# Altium footprint library csy.PcbLib: 198 footprints (part 11 of 13)
Each footprint in its own frame and in the unit in brackets; x right, y up, seen from the top. Pads: shape width x height; smd on the part's side, far side on the other; paste and mask are expansions set on the pad; w line width, h text height; cw(c..) or ccw(c..) is an arc to the next point about the centre after c.
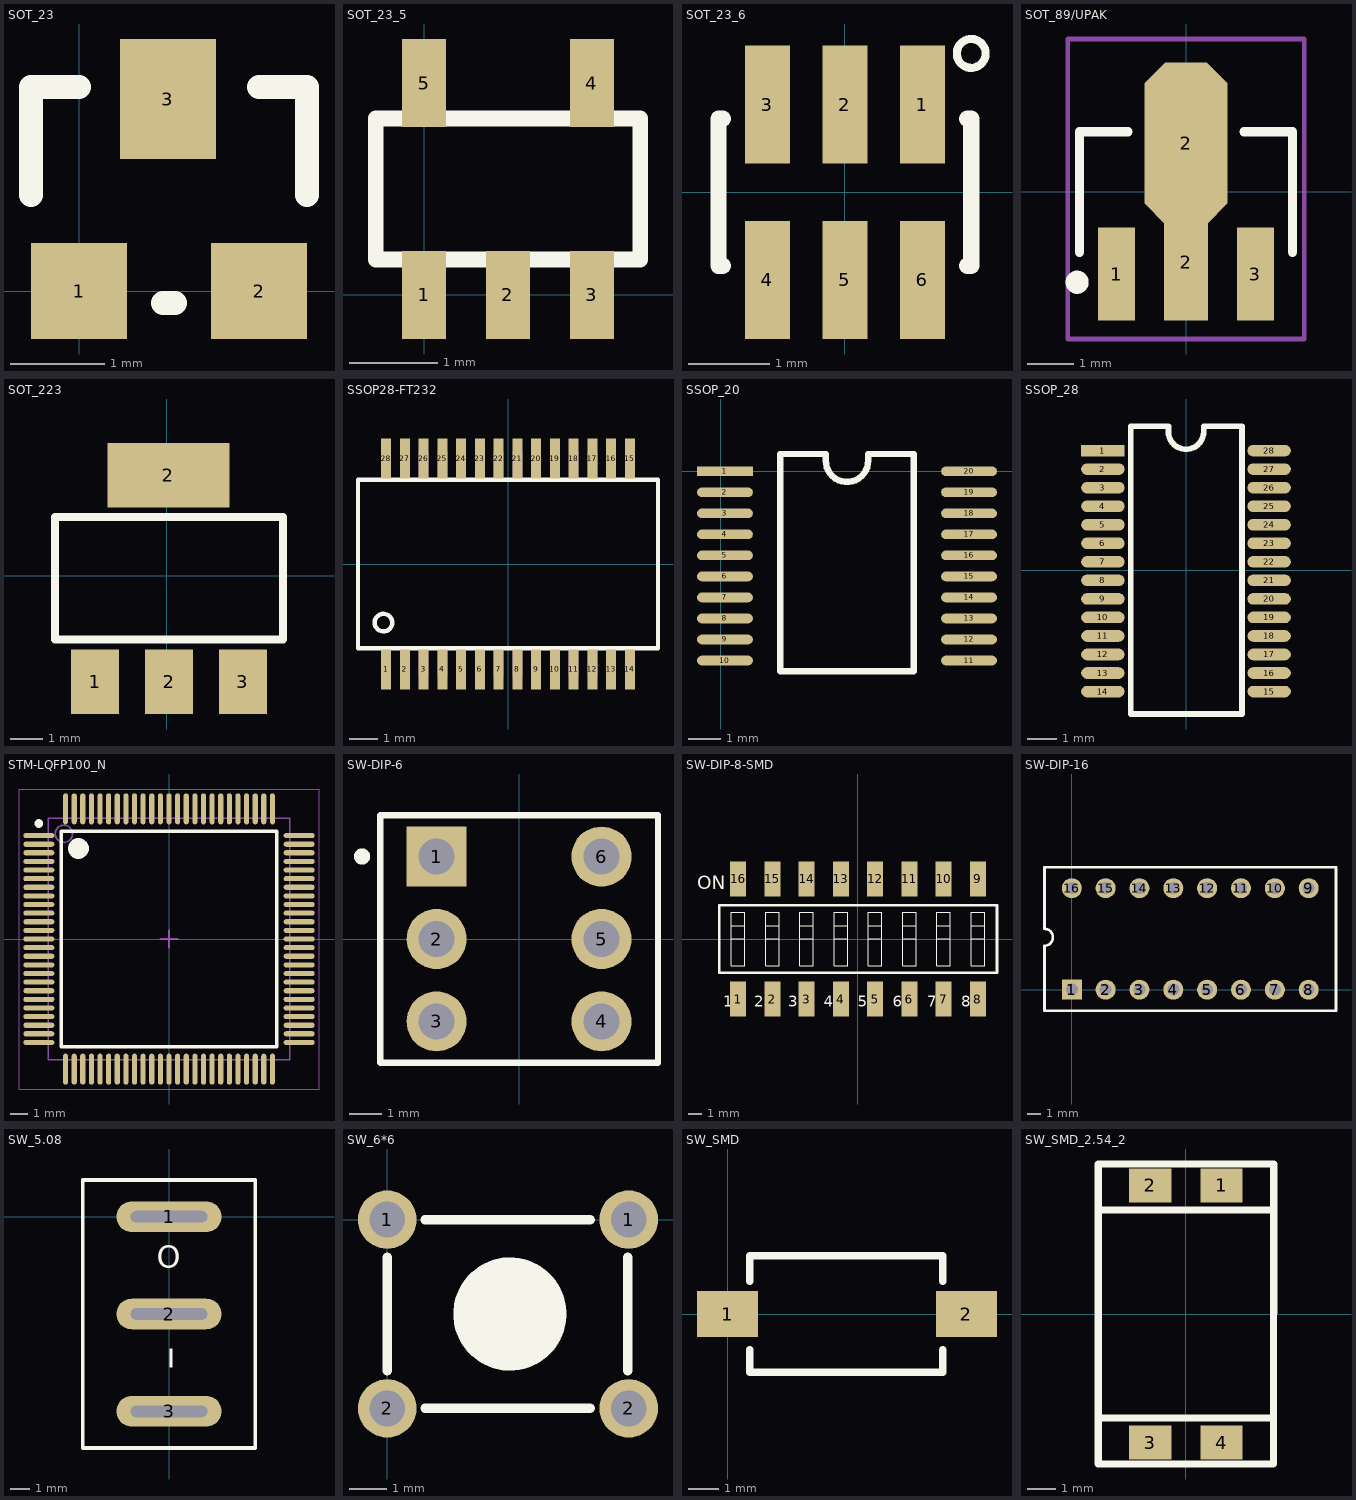
[diagram p10: the footprints below, top view; thin cyan lines are the x and y axes]

## SOT_23 [mil]
pads (3):
  rect 40x40 smd: 1(0,0) 2(75,0)
  rect 40x50 smd: 3(37,80)
Top Overlay:
  lines w10: -20,40 -20,85 0,85 ; 35,-5 40,-5 ; 75,85 95,85 95,40
3D body "SOT-23-3.STEP": height 47.24, standoff 0, extent -19.76,-11.65 94.42,98.59

## SOT_23_5 [mm]
pads (5):
  rect 0.5x1 smd: 1(0,0) 2(0.95,0) 3(1.9,0) 4(1.9,2.4) 5(0,2.4)
Top Overlay:
  lines w0.178: -0.55,0.4 -0.55,2 2.45,2 2.45,0.4 -0.55,0.4
3D body "User Library-SOT23-5.STEP": height 1.09, standoff -0.01, extent -0.5,-0.201 2.399,2.599

## SOT_23_6 [mm] "SOT-23/SC-74A; 5 Leads; Body 3.1 x 3 mm, inc. leads (LxW max)"
height 1.45
pads (6):
  rect 0.55x1.45 smd: 1(0.95,1.075) 2(0,1.075) 3(-0.95,1.075) 4(-0.95,-1.075) 5(0,-1.075) 6(0.95,-1.075)
Top Overlay:
  circle w0.1: c1.549,1.702 r0.177
  lines w0.2: -1.5,-0.9 -1.55,-0.9 -1.55,0.9 -1.5,0.9 ; 1.5,-0.9 1.55,-0.9 1.55,0.9 1.5,0.9
3D body "User Library-SOT-23-6.STEP": height 1.08, standoff -0.01, extent -1.397,-1.194 1.397,1.232

## SOT_89/UPAK [mm]
height 1.6
pads (4):
  rect 0.8x2 smd: 1(-1.5,-1.773) 3(1.5,-1.773)
  rect 0.96x2.5 smd: 2(0,-1.523)
  oct 1.8x3.5 smd: 2(0,1.049)
Top Overlay:
  circle w0.25: c-2.35,-1.95 r0.125
  lines w0.2: -2.3,-1.3 -2.3,1.3 -1.25,1.3 ; 1.25,1.3 2.3,1.3 2.3,-1.3
Mechanical 15:
  lines w0.1: -0.5,0 0.5,0 ; 0,-0.5 0,0.5 ; -2.55,-3.175 -2.55,3.302 2.55,3.302 2.55,-3.175 -2.55,-3.175
3D body "SOT_89.STEP": height 1.52, standoff 0.01, extent -2.25,-2.325 2.25,1.825

## SOT_223 [mil]
pads (4):
  rect 59x79 smd: 1(-88,-130) 2(2.55,-130) 3(93.1,-130)
  rect 150x79 smd: 2(1.88,123.54)
Top Overlay:
  lines w10: -137.45,-78 142.55,-78 142.55,72 -137.45,72 -137.45,-78
3D body: height 66.93, standoff 0, extent -126.41,-138.72 129.5,135.3

## SSOP28-FT232 [mm]
pads (28):
  rect 0.348x1.397 smd: 1(-4.225,-3.656) 2(-3.575,-3.656) 3(-2.925,-3.656) 4(-2.275,-3.656) 5(-1.625,-3.656) 6(-0.975,-3.656) 7(-0.325,-3.656) 8(0.325,-3.656) 9(0.975,-3.656) 10(1.625,-3.656) 11(2.275,-3.656) 12(2.925,-3.656) 13(3.575,-3.656) 14(4.225,-3.656) 15(4.225,3.656) 16(3.575,3.656) 17(2.925,3.656) 18(2.275,3.656) 19(1.625,3.656) 20(0.975,3.656) 21(0.325,3.656) 22(-0.325,3.656) 23(-0.975,3.656) 24(-1.625,3.656) 25(-2.275,3.656) 26(-2.925,3.656) 27(-3.575,3.656) 28(-4.225,3.656)
Top Overlay:
  circle w0.152: c-4.318,-2.032 r0.305
  lines w0.152: -5.2,-2.925 -5.2,2.925 5.2,2.925 5.2,-2.925 -5.2,-2.925
Mechanical 4:
  drawing of 56 lines, arcs and shapes, not listed

## SSOP_20 [mm]
pads (20):
  rect 1.727x0.3 smd: 1(0.127,0)
  oval 1.727x0.3 smd: 2(0.127,-0.65) 3(0.127,-1.3) 4(0.127,-1.95) 5(0.127,-2.6) 6(0.127,-3.25) 7(0.127,-3.9) 8(0.127,-4.55) 9(0.127,-5.2) 10(0.127,-5.85) 11(7.673,-5.85) 12(7.673,-5.2) 13(7.673,-4.55) 14(7.673,-3.9) 15(7.673,-3.25) 16(7.673,-2.6) 17(7.673,-1.95) 18(7.673,-1.3) 19(7.673,-0.65) 20(7.673,0)
Top Overlay:
  lines w0.2: 1.835,-6.175 5.965,-6.175 5.965,0.533 4.555,0.533 4.555,0.325 cw(c3.9,0.325) 3.245,0.325 3.245,0.533 1.835,0.533 1.835,-6.175
3D body "SSOP-20.STEP": height 1.79, standoff -0.05, extent -0.013,-6.52 7.887,0.78

## SSOP_28 [mm]
pads (28):
  rect 1.5x0.4 smd: 1(-2.869,4.127)
  oval 1.5x0.4 smd: 2(-2.869,3.488) 3(-2.869,2.848) 4(-2.869,2.208) 5(-2.869,1.568) 6(-2.869,0.928) 7(-2.869,0.288) 8(-2.869,-0.352) 9(-2.869,-0.992) 10(-2.869,-1.631) 11(-2.869,-2.271) 12(-2.869,-2.911) 13(-2.869,-3.551) 14(-2.87,-4.191) 15(2.869,-4.191) 16(2.869,-3.551) 17(2.869,-2.911) 18(2.869,-2.271) 19(2.869,-1.631) 20(2.869,-0.992) 21(2.869,-0.352) 22(2.869,0.288) 23(2.869,0.928) 24(2.869,1.568) 25(2.869,2.208) 26(2.869,2.848) 27(2.869,3.488) 28(2.869,4.127)
Top Overlay:
  lines w0.2: -1.905,-4.966 1.93,-4.966 1.93,4.966 0.609,4.966 0.609,4.783 cw(c0,4.783) -0.609,4.783 -0.609,4.966 -1.905,4.966 -1.905,-4.966
3D body "TSSOP28.STEP": height 1.05, standoff 0, extent -3.273,-4.889 3.327,4.91

## STM-LQFP100_N [mm] "Thin QFP, 100-Leads, Body 14x14mm, Pitch 0.5mm, IPC Medium Density"
height 1.6
pads (100):
  oval 1.8x0.3 smd: 1(-7.55,6) 2(-7.55,5.5) 3(-7.55,5) 4(-7.55,4.5) 5(-7.55,4) 6(-7.55,3.5) 7(-7.55,3) 8(-7.55,2.5) 9(-7.55,2) 10(-7.55,1.5) 11(-7.55,1) 12(-7.55,0.5) 13(-7.55,0) 14(-7.55,-0.5) 15(-7.55,-1) 16(-7.55,-1.5) 17(-7.55,-2) 18(-7.55,-2.5) 19(-7.55,-3) 20(-7.55,-3.5) 21(-7.55,-4) 22(-7.55,-4.5) 23(-7.55,-5) 24(-7.55,-5.5) 25(-7.55,-6) 51(7.55,-6) 52(7.55,-5.5) 53(7.55,-5) 54(7.55,-4.5) 55(7.55,-4) 56(7.55,-3.5) 57(7.55,-3) 58(7.55,-2.5) 59(7.55,-2) 60(7.55,-1.5) 61(7.55,-1) 62(7.55,-0.5) 63(7.55,0) 64(7.55,0.5) 65(7.55,1) 66(7.55,1.5) 67(7.55,2) 68(7.55,2.5) 69(7.55,3) 70(7.55,3.5) 71(7.55,4) 72(7.55,4.5) 73(7.55,5) 74(7.55,5.5) 75(7.55,6)
  oval 0.3x1.8 smd: 26(-6,-7.55) 27(-5.5,-7.55) 28(-5,-7.55) 29(-4.5,-7.55) 30(-4,-7.55) 31(-3.5,-7.55) 32(-3,-7.55) 33(-2.5,-7.55) 34(-2,-7.55) 35(-1.5,-7.55) 36(-1,-7.55) 37(-0.5,-7.55) 38(0,-7.55) 39(0.5,-7.55) 40(1,-7.55) 41(1.5,-7.55) 42(2,-7.55) 43(2.5,-7.55) 44(3,-7.55) 45(3.5,-7.55) 46(4,-7.55) 47(4.5,-7.55) 48(5,-7.55) 49(5.5,-7.55) 50(6,-7.55) 76(6,7.55) 77(5.5,7.55) 78(5,7.55) 79(4.5,7.55) 80(4,7.55) 81(3.5,7.55) 82(3,7.55) 83(2.5,7.55) 84(2,7.55) 85(1.5,7.55) 86(1,7.55) 87(0.5,7.55) 88(0,7.55) 89(-0.5,7.55) 90(-1,7.55) 91(-1.5,7.55) 92(-2,7.55) 93(-2.5,7.55) 94(-3,7.55) 95(-3.5,7.55) 96(-4,7.55) 97(-4.5,7.55) 98(-5,7.55) 99(-5.5,7.55) 100(-6,7.55)
Top Overlay:
  circle w0.25: c-7.55,6.7 r0.125
  circle w0.6: c-5.25,5.25 r0.3
  lines w0.2: -6.25,-6.25 -6.25,6.25 6.25,6.25 6.25,-6.25 -6.25,-6.25
Mechanical 13:
  circle w0.1: c-6.1,6.1 r0.5
  lines w0.1: -7,-7 -7,7 7,7 7,-7 -7,-7
Mechanical 15:
  lines w0.05: -8.7,-8.7 -8.7,8.7 8.7,8.7 8.7,-8.7 -8.7,-8.7
  lines w0.1: -0.5,0 0.5,0 ; 0,-0.5 0,0.5
3D body: height 1.6, standoff 0.05, extent -7,-7 7,7

## SW-DIP-6 [mm] "Switch; 6 Leads"
pads (6):
  rect 1.85x1.85 hole 1.1: 1(-2.54,2.54)
  round 1.85 hole 1.1: 2(-2.54,0) 3(-2.54,-2.54) 4(2.54,-2.54) 5(2.54,0) 6(2.54,2.54)
Top Overlay:
  circle w0.25: c-4.836,2.541 r0.125
  lines w0.2: -4.28,-3.81 4.28,-3.81 4.28,3.81 -4.28,3.81 -4.28,-3.81
3D body "SW3dPS-DIP-Schalter SMD 3polig RM2,54.STEP": height 3.55, standoff -0.65, extent -3.81,-3.683 3.81,3.937

## SW-DIP-8-SMD [mm] "DIP Switch; 16 Leads"
height 5.06
pads (16):
  rect 1.2x2.6 smd: 1(-8.89,-4.45) 2(-6.35,-4.45) 3(-3.81,-4.45) 4(-1.27,-4.45) 5(1.27,-4.45) 6(3.81,-4.45) 7(6.35,-4.45) 8(8.89,-4.45) 9(8.89,4.45) 10(6.35,4.45) 11(3.81,4.45) 12(1.27,4.45) 13(-1.27,4.45) 14(-3.81,4.45) 15(-6.35,4.45) 16(-8.89,4.45)
Top Overlay:
  lines w0.025: -9.39,0 -8.39,0 ; -9.39,1 -8.39,1 ; -6.85,0 -5.85,0 ; -6.85,1 -5.85,1 ; -4.31,0 -3.31,0 ; -4.31,1 -3.31,1 ; -1.77,0 -0.77,0 ; -1.77,1 -0.77,1 ; 0.77,0 1.77,0 ; 0.77,1 1.77,1 ; 3.31,0 4.31,0 ; 3.31,1 4.31,1 ; 5.85,0 6.85,0 ; 5.85,1 6.85,1 ; 8.39,0 9.39,0 ; 8.39,1 9.39,1 ; -9.39,-2 -8.39,-2 -8.39,2 -9.39,2 -9.39,-2 ; -6.85,-2 -5.85,-2 -5.85,2 -6.85,2 -6.85,-2 ; -4.31,-2 -3.31,-2 -3.31,2 -4.31,2 -4.31,-2 ; -1.77,-2 -0.77,-2 -0.77,2 -1.77,2 -1.77,-2 ; 0.77,-2 1.77,-2 1.77,2 0.77,2 0.77,-2 ; 3.31,-2 4.31,-2 4.31,2 3.31,2 3.31,-2 ; 5.85,-2 6.85,-2 6.85,2 5.85,2 5.85,-2 ; 8.39,-2 9.39,-2 9.39,2 8.39,2 8.39,-2
  lines w0.2: -10.29,-2.5 10.31,-2.5 10.31,2.5 -10.29,2.5 -10.29,-2.5
  text "8" at 7.659,-5.032 h0.8
  text "7" at 5.119,-5.032 h0.8
  text "ON" at -11.938,3.678 h1
  text "1" at -10.006,-5.032 h0.8
  text "2" at -7.681,-5.032 h0.8
  text "3" at -5.181,-5.032 h0.8
  text "4" at -2.556,-5.032 h0.8
  text "5" at -0.031,-5.032 h0.8
  text "6" at 2.569,-5.032 h0.8
3D body "SW3dPS-219-8MST.STEP": height 4.3, standoff 0.05, extent -10.182,-4.83 10.182,5.08

## SW-DIP-16 [mm] "DIP; 16 Leads; Row Spacing 7.62 mm; Pitch 2.54 mm"
pads (16):
  rect 1.5x1.5 hole 0.9: 1(0,0)
  round 1.5 hole 0.9: 2(2.54,0) 3(5.08,0) 4(7.62,0) 5(10.16,0) 6(12.7,0) 7(15.24,0) 8(17.78,0) 9(17.78,7.62) 10(15.24,7.62) 11(12.7,7.62) 12(10.16,7.62) 13(7.62,7.62) 14(5.08,7.62) 15(2.54,7.62) 16(0,7.62)
Top Overlay:
  lines w0.2: -2.05,4.57 cw(c-2.05,3.935) -2.05,3.3 -2.05,-1.59 19.83,-1.59 19.83,9.2 -2.05,9.2 -2.05,4.6
3D body "SW3dPS-DIP SWITCH 8 POS CTS 206.STEP": height 8.25, standoff -3.5, extent -2.286,-1.08 20.214,8.7

## SW_5.08 [mm]
pads (3):
  oval 5.5x1.6 hole 0.6 slot 4 at 0 deg: 1(0,0) 2(0,-5.08) 3(0,-10.16)
Top Overlay:
  lines w0.2: -4.5,-12.08 4.5,-12.08 4.5,1.92 -4.5,1.92 -4.5,-12.025
  text "O" at -0.635,-3.048 h2
  text "I" at -0.127,-8.255 h2

## SW_6*6 [mil] "1与3内部短接；2与4内部短接额"
pads (4):
  round 62 hole 38: 1(0,0) 1(255.91,0) 2(0,-200) 2(255.91,-200)
Top Overlay:
  circle w60: c130,-100 r30
  lines w10: -0.03,-160 -0.03,-40 ; 39.97,-200 215,-200 ; 39.97,0 215,0 ; 255,-160 255,-40

## SW_SMD [mm]
pads (2):
  rect 2x1.5 smd: 1(0,0) 2(7.8,0)
Top Overlay:
  lines w0.254: 0.725,-1.168 0.725,-1.9 7.025,-1.9 7.025,-1.168 ; 0.725,1.067 0.725,1.9 7.025,1.9 7.025,1.067
3D body "SMD按键.": height 2.5, standoff 0, extent -0.059,-1.945 7.831,1.905

## SW_SMD_2.54_2 [mm]
pads (4):
  rect 1.5x1.2 smd: 1(1.27,4.572) 2(-1.27,4.572) 3(-1.27,-4.572) 4(1.27,-4.572)
Top Overlay:
  lines w0.254: -3.12,-3.704 3.12,-3.704 ; -3.12,3.704 3.12,3.704 ; -3.12,-5.334 -3.12,5.334 3.124,5.334 3.12,-5.334 -3.12,-5.334
3D body "拨码开关.STEP": height 4.6, standoff 0, extent -3.12,-4.41 3.12,4.41